# Altium schematic symbol library Analog Devices Data Converters Digital-to-Analog Converters.SchLib: 2231 symbols (part 98 of 135)
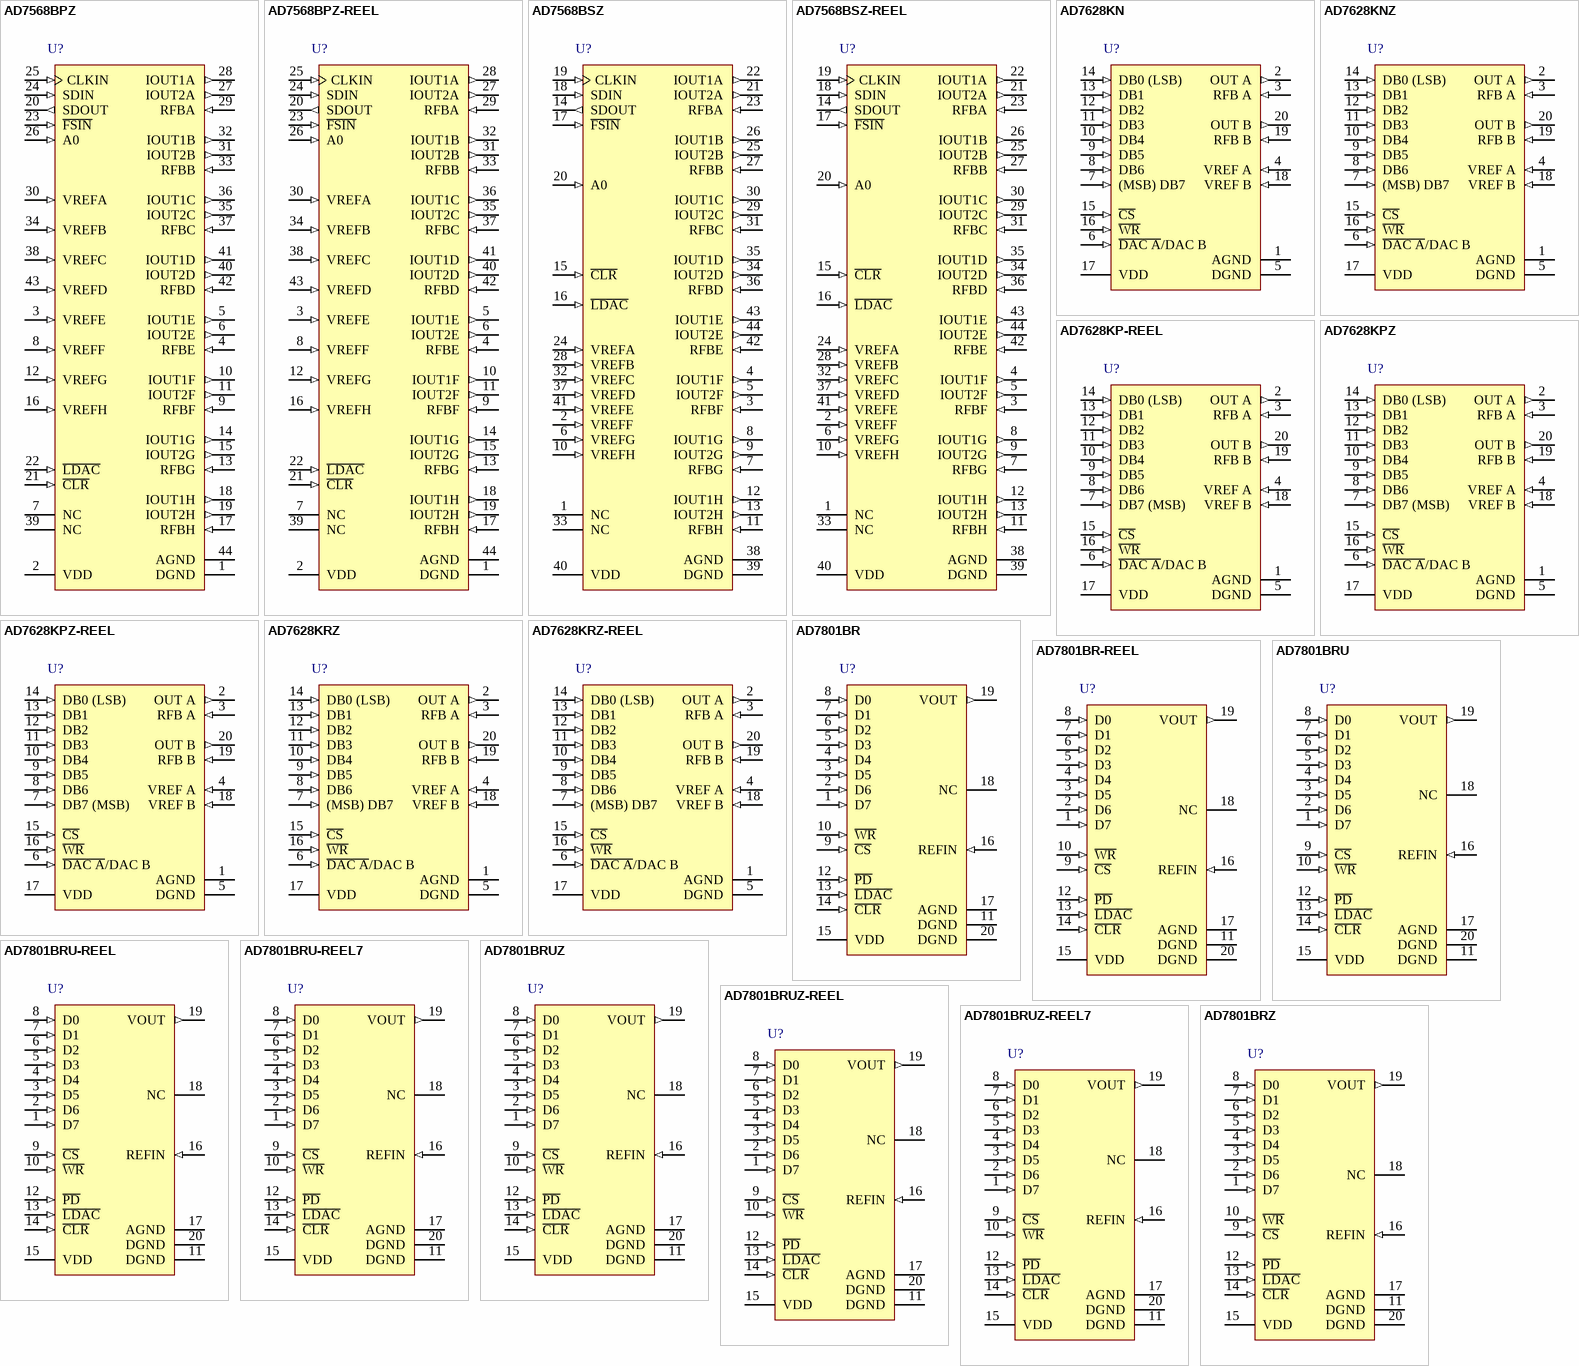
[diagram p210: symbols AD7568BPZ to AD7801BRZ]

## AD7801BRU-REEL
designator U?
Single 8-Bit Voltage Output Digital-to-Analog Converter with Parallel Interface, 2.7 to 5.5 V, -40 to +105 degC, RU-20, Reel; Generic Part Number: AD7801; Manufacturer: Analog Devices; PartNumber: AD7801BRU-REEL; # DAC Outputs: 1; Max V+: 5.5V; Op Pwr Diss: 12.9mW; Resolution (Bits): 8; Settling Time: 1.2µs; Single Supply: Yes; DatasheetVersion: Rev.0; PackageVersion: 2000; PackageReference: RU-20; PackageDescription: 20-Lead Thin Shrink Small Outline Package [TSSOP]; Supplier 1: Mouser; Supplier Part Number 1: N/A; Packing: Reel; RoHS: N; Mounting Technology: Surface Mount; Code_JEDEC: MO-153AC; ComponentLink1Description: Manufacturer URL; ComponentLink1URL: http://www.analog.com/en/index.html; ComponentLink2Description: Datasheet; ComponentLink2URL: http://www.analog.com/static/imported-files/data_sheets/AD7801.pdf; ComponentLink3Description: Package Specification; ComponentLink3URL: http://www.analog.com/static/imported-files/packages/364515793657813558433715854054607941441RU20.pdf; ComponentLink4Description: Product URL; ComponentLink4URL: http://www.analog.com/en/digital-to-analog-converters/da-converters/ad7801/products/product.html
footprint RU-20_N (TSOP, 20-Leads, Body 6.5x4.4mm, Pitch 0.65mm, IPC Medium Density)
footprint RU-20_L (TSOP, 20-Leads, Body 6.5x4.4mm, Pitch 0.65mm, IPC High Density)
footprint RU-20_M (TSOP, 20-Leads, Body 6.5x4.4mm, Pitch 0.65mm, IPC Low Density)
pins: 1 D7 (in) "Parallel Data Inputs. 8-bit data is loaded to the input register of the AD7801 under the control of C\S\ and W\R\.", 2 D6 (in) "Parallel Data Inputs. 8-bit data is loaded to the input register of the AD7801 under the control of C\S\ and W\R\.", 3 D5 (in) "Parallel Data Inputs. 8-bit data is loaded to the input register of the AD7801 under the control of C\S\ and W\R\.", 4 D4 (in) "Parallel Data Inputs. 8-bit data is loaded to the input register of the AD7801 under the control of C\S\ and W\R\.", 5 D3 (in) "Parallel Data Inputs. 8-bit data is loaded to the input register of the AD7801 under the control of C\S\ and W\R\.", 6 D2 (in) "Parallel Data Inputs. 8-bit data is loaded to the input register of the AD7801 under the control of C\S\ and W\R\.", 7 D1 (in) "Parallel Data Inputs. 8-bit data is loaded to the input register of the AD7801 under the control of C\S\ and W\R\.", 8 D0 (in) "Parallel Data Inputs. 8-bit data is loaded to the input register of the AD7801 under the control of C\S\ and W\R\.", 9 ~{CS} (in) "Chip Select. Active low logic input.", 10 ~{WR} (in) "Write Input. W\R\ is an active low logic input used in conjunction with C\S\ to write data to the input register.", 11 DGND (power) "Digital Ground", 12 ~{PD} (in) "Active low input used to put the part into low power mode reducing current consumption to less than 1 uA.", 13 ~{LDAC} (in) "Load DAC Logic Input. When this logic input is taken low the DAC output is updated with the contents of its DAC register. If L\D\A\C\ is permanently tied low the DAC is updated on the rising edge of W\R\.", 14 ~{CLR} (in) "Asynchronous Clear Input (Active Low). When this input is taken low the DAC register is loaded with all zeroes and the DAC output is cleared to zero volts.", 15 VDD (power) "Power Supply Input. This part can be operated from +2.7 V to +5.5 V and should be decoupled to GND.", 16 REFIN (in) "External Reference Input. This can be used as the reference for the DAC. The range on this reference input is 1 V to VDD/2. If REFIN is tied directly to VDD the internal VDD/2 reference is selected.", 17 AGND (power) "Analog Ground reference point and return point for all analog current on the part.", 18 NC "No Connect Pin.", 19 VOUT (out) "Analog Output Voltage from the DAC. The output amplifier can swing rail to rail on its output.", 20 DGND (power) "Digital Ground reference point and return point for all digital current on the part."

## AD7801BRU-REEL7
designator U?
Single 8-Bit Voltage Output Digital-to-Analog Converter with Parallel Interface, 2.7 to 5.5 V, -40 to +105 degC, RU-20, Reel; Generic Part Number: AD7801; Manufacturer: Analog Devices; PartNumber: AD7801BRU-REEL7; # DAC Outputs: 1; Max V+: 5.5V; Op Pwr Diss: 12.9mW; Resolution (Bits): 8; Settling Time: 1.2µs; Single Supply: Yes; DatasheetVersion: Rev.0; PackageVersion: 2000; PackageReference: RU-20; PackageDescription: 20-Lead Thin Shrink Small Outline Package [TSSOP]; Supplier 1: Digi-Key; Supplier Part Number 1: AD7801BRU-REEL7-ND; Supplier 2: Newark; Supplier Part Number 2: 09B5961; Supplier 3: Mouser; Supplier Part Number 3: 584-AD7801BRU-R7; Packing: Reel; RoHS: N; Mounting Technology: Surface Mount; Code_JEDEC: MO-153AC; ComponentLink1Description: Manufacturer URL; ComponentLink1URL: http://www.analog.com/en/index.html; ComponentLink2Description: Datasheet; ComponentLink2URL: http://www.analog.com/static/imported-files/data_sheets/AD7801.pdf; ComponentLink3Description: Package Specification; ComponentLink3URL: http://www.analog.com/static/imported-files/packages/364515793657813558433715854054607941441RU20.pdf; ComponentLink4Description: Product URL; ComponentLink4URL: http://www.analog.com/en/digital-to-analog-converters/da-converters/ad7801/products/product.html
footprint RU-20_N (TSOP, 20-Leads, Body 6.5x4.4mm, Pitch 0.65mm, IPC Medium Density)
footprint RU-20_L (TSOP, 20-Leads, Body 6.5x4.4mm, Pitch 0.65mm, IPC High Density)
footprint RU-20_M (TSOP, 20-Leads, Body 6.5x4.4mm, Pitch 0.65mm, IPC Low Density)
pins: 1 D7 (in) "Parallel Data Inputs. 8-bit data is loaded to the input register of the AD7801 under the control of C\S\ and W\R\.", 2 D6 (in) "Parallel Data Inputs. 8-bit data is loaded to the input register of the AD7801 under the control of C\S\ and W\R\.", 3 D5 (in) "Parallel Data Inputs. 8-bit data is loaded to the input register of the AD7801 under the control of C\S\ and W\R\.", 4 D4 (in) "Parallel Data Inputs. 8-bit data is loaded to the input register of the AD7801 under the control of C\S\ and W\R\.", 5 D3 (in) "Parallel Data Inputs. 8-bit data is loaded to the input register of the AD7801 under the control of C\S\ and W\R\.", 6 D2 (in) "Parallel Data Inputs. 8-bit data is loaded to the input register of the AD7801 under the control of C\S\ and W\R\.", 7 D1 (in) "Parallel Data Inputs. 8-bit data is loaded to the input register of the AD7801 under the control of C\S\ and W\R\.", 8 D0 (in) "Parallel Data Inputs. 8-bit data is loaded to the input register of the AD7801 under the control of C\S\ and W\R\.", 9 ~{CS} (in) "Chip Select. Active low logic input.", 10 ~{WR} (in) "Write Input. W\R\ is an active low logic input used in conjunction with C\S\ to write data to the input register.", 11 DGND (power) "Digital Ground", 12 ~{PD} (in) "Active low input used to put the part into low power mode reducing current consumption to less than 1 uA.", 13 ~{LDAC} (in) "Load DAC Logic Input. When this logic input is taken low the DAC output is updated with the contents of its DAC register. If L\D\A\C\ is permanently tied low the DAC is updated on the rising edge of W\R\.", 14 ~{CLR} (in) "Asynchronous Clear Input (Active Low). When this input is taken low the DAC register is loaded with all zeroes and the DAC output is cleared to zero volts.", 15 VDD (power) "Power Supply Input. This part can be operated from +2.7 V to +5.5 V and should be decoupled to GND.", 16 REFIN (in) "External Reference Input. This can be used as the reference for the DAC. The range on this reference input is 1 V to VDD/2. If REFIN is tied directly to VDD the internal VDD/2 reference is selected.", 17 AGND (power) "Analog Ground reference point and return point for all analog current on the part.", 18 NC "No Connect Pin.", 19 VOUT (out) "Analog Output Voltage from the DAC. The output amplifier can swing rail to rail on its output.", 20 DGND (power) "Digital Ground reference point and return point for all digital current on the part."

## AD7801BRUZ
designator U?
Single 8-Bit Voltage Output Digital-to-Analog Converter with Parallel Interface, 2.7 to 5.5 V, -40 to +105 degC, RU-20, Pb-Free, Tube; Generic Part Number: AD7801; Manufacturer: Analog Devices; PartNumber: AD7801BRUZ; # DAC Outputs: 1; Max V+: 5.5V; Op Pwr Diss: 12.9mW; Resolution (Bits): 8; Settling Time: 1.2µs; Single Supply: Yes; DatasheetVersion: Rev.0; PackageVersion: 2000; PackageReference: RU-20; PackageDescription: 20-Lead Thin Shrink Small Outline Package [TSSOP]; Supplier 1: Digi-Key; Supplier Part Number 1: AD7801BRUZ-ND; Supplier 2: Farnell; Supplier Part Number 2: 1319407; Supplier 3: Newark; Supplier Part Number 3: 19M8854; Supplier 4: Mouser; Supplier Part Number 4: 584-AD7801BRUZ; Packing: Tube; RoHS: Y; Mounting Technology: Surface Mount; Code_JEDEC: MO-153AC; ComponentLink1Description: Manufacturer URL; ComponentLink1URL: http://www.analog.com/en/index.html; ComponentLink2Description: Datasheet; ComponentLink2URL: http://www.analog.com/static/imported-files/data_sheets/AD7801.pdf; ComponentLink3Description: Package Specification; ComponentLink3URL: http://www.analog.com/static/imported-files/packages/364515793657813558433715854054607941441RU20.pdf; ComponentLink4Description: Product URL; ComponentLink4URL: http://www.analog.com/en/digital-to-analog-converters/da-converters/ad7801/products/product.html
footprint RU-20_N (TSOP, 20-Leads, Body 6.5x4.4mm, Pitch 0.65mm, IPC Medium Density)
footprint RU-20_L (TSOP, 20-Leads, Body 6.5x4.4mm, Pitch 0.65mm, IPC High Density)
footprint RU-20_M (TSOP, 20-Leads, Body 6.5x4.4mm, Pitch 0.65mm, IPC Low Density)
pins: 1 D7 (in) "Parallel Data Inputs. 8-bit data is loaded to the input register of the AD7801 under the control of C\S\ and W\R\.", 2 D6 (in) "Parallel Data Inputs. 8-bit data is loaded to the input register of the AD7801 under the control of C\S\ and W\R\.", 3 D5 (in) "Parallel Data Inputs. 8-bit data is loaded to the input register of the AD7801 under the control of C\S\ and W\R\.", 4 D4 (in) "Parallel Data Inputs. 8-bit data is loaded to the input register of the AD7801 under the control of C\S\ and W\R\.", 5 D3 (in) "Parallel Data Inputs. 8-bit data is loaded to the input register of the AD7801 under the control of C\S\ and W\R\.", 6 D2 (in) "Parallel Data Inputs. 8-bit data is loaded to the input register of the AD7801 under the control of C\S\ and W\R\.", 7 D1 (in) "Parallel Data Inputs. 8-bit data is loaded to the input register of the AD7801 under the control of C\S\ and W\R\.", 8 D0 (in) "Parallel Data Inputs. 8-bit data is loaded to the input register of the AD7801 under the control of C\S\ and W\R\.", 9 ~{CS} (in) "Chip Select. Active low logic input.", 10 ~{WR} (in) "Write Input. W\R\ is an active low logic input used in conjunction with C\S\ to write data to the input register.", 11 DGND (power) "Digital Ground", 12 ~{PD} (in) "Active low input used to put the part into low power mode reducing current consumption to less than 1 uA.", 13 ~{LDAC} (in) "Load DAC Logic Input. When this logic input is taken low the DAC output is updated with the contents of its DAC register. If L\D\A\C\ is permanently tied low the DAC is updated on the rising edge of W\R\.", 14 ~{CLR} (in) "Asynchronous Clear Input (Active Low). When this input is taken low the DAC register is loaded with all zeroes and the DAC output is cleared to zero volts.", 15 VDD (power) "Power Supply Input. This part can be operated from +2.7 V to +5.5 V and should be decoupled to GND.", 16 REFIN (in) "External Reference Input. This can be used as the reference for the DAC. The range on this reference input is 1 V to VDD/2. If REFIN is tied directly to VDD the internal VDD/2 reference is selected.", 17 AGND (power) "Analog Ground reference point and return point for all analog current on the part.", 18 NC "No Connect Pin.", 19 VOUT (out) "Analog Output Voltage from the DAC. The output amplifier can swing rail to rail on its output.", 20 DGND (power) "Digital Ground reference point and return point for all digital current on the part."

## AD7801BRUZ-REEL
designator U?
Single 8-Bit Voltage Output Digital-to-Analog Converter with Parallel Interface, 2.7 to 5.5 V, -40 to +105 degC, RU-20, Pb-Free, Reel; Generic Part Number: AD7801; Manufacturer: Analog Devices; PartNumber: AD7801BRUZ-REEL; # DAC Outputs: 1; Max V+: 5.5V; Op Pwr Diss: 12.9mW; Resolution (Bits): 8; Settling Time: 1.2µs; Single Supply: Yes; DatasheetVersion: Rev.0; PackageVersion: 2000; PackageReference: RU-20; PackageDescription: 20-Lead Thin Shrink Small Outline Package [TSSOP]; Supplier 1: Digi-Key; Supplier Part Number 1: AD7801BRUZ-REEL-ND; Supplier 2: Mouser; Supplier Part Number 2: 584-AD7801BRUZ-R; Packing: Reel; RoHS: Y; Mounting Technology: Surface Mount; Code_JEDEC: MO-153AC; ComponentLink1Description: Manufacturer URL; ComponentLink1URL: http://www.analog.com/en/index.html; ComponentLink2Description: Datasheet; ComponentLink2URL: http://www.analog.com/static/imported-files/data_sheets/AD7801.pdf; ComponentLink3Description: Package Specification; ComponentLink3URL: http://www.analog.com/static/imported-files/packages/364515793657813558433715854054607941441RU20.pdf; ComponentLink4Description: Product URL; ComponentLink4URL: http://www.analog.com/en/digital-to-analog-converters/da-converters/ad7801/products/product.html
footprint RU-20_N (TSOP, 20-Leads, Body 6.5x4.4mm, Pitch 0.65mm, IPC Medium Density)
footprint RU-20_L (TSOP, 20-Leads, Body 6.5x4.4mm, Pitch 0.65mm, IPC High Density)
footprint RU-20_M (TSOP, 20-Leads, Body 6.5x4.4mm, Pitch 0.65mm, IPC Low Density)
pins: 1 D7 (in) "Parallel Data Inputs. 8-bit data is loaded to the input register of the AD7801 under the control of C\S\ and W\R\.", 2 D6 (in) "Parallel Data Inputs. 8-bit data is loaded to the input register of the AD7801 under the control of C\S\ and W\R\.", 3 D5 (in) "Parallel Data Inputs. 8-bit data is loaded to the input register of the AD7801 under the control of C\S\ and W\R\.", 4 D4 (in) "Parallel Data Inputs. 8-bit data is loaded to the input register of the AD7801 under the control of C\S\ and W\R\.", 5 D3 (in) "Parallel Data Inputs. 8-bit data is loaded to the input register of the AD7801 under the control of C\S\ and W\R\.", 6 D2 (in) "Parallel Data Inputs. 8-bit data is loaded to the input register of the AD7801 under the control of C\S\ and W\R\.", 7 D1 (in) "Parallel Data Inputs. 8-bit data is loaded to the input register of the AD7801 under the control of C\S\ and W\R\.", 8 D0 (in) "Parallel Data Inputs. 8-bit data is loaded to the input register of the AD7801 under the control of C\S\ and W\R\.", 9 ~{CS} (in) "Chip Select. Active low logic input.", 10 ~{WR} (in) "Write Input. W\R\ is an active low logic input used in conjunction with C\S\ to write data to the input register.", 11 DGND (power) "Digital Ground", 12 ~{PD} (in) "Active low input used to put the part into low power mode reducing current consumption to less than 1 uA.", 13 ~{LDAC} (in) "Load DAC Logic Input. When this logic input is taken low the DAC output is updated with the contents of its DAC register. If L\D\A\C\ is permanently tied low the DAC is updated on the rising edge of W\R\.", 14 ~{CLR} (in) "Asynchronous Clear Input (Active Low). When this input is taken low the DAC register is loaded with all zeroes and the DAC output is cleared to zero volts.", 15 VDD (power) "Power Supply Input. This part can be operated from +2.7 V to +5.5 V and should be decoupled to GND.", 16 REFIN (in) "External Reference Input. This can be used as the reference for the DAC. The range on this reference input is 1 V to VDD/2. If REFIN is tied directly to VDD the internal VDD/2 reference is selected.", 17 AGND (power) "Analog Ground reference point and return point for all analog current on the part.", 18 NC "No Connect Pin.", 19 VOUT (out) "Analog Output Voltage from the DAC. The output amplifier can swing rail to rail on its output.", 20 DGND (power) "Digital Ground reference point and return point for all digital current on the part."

## AD7801BRUZ-REEL7
designator U?
Single 8-Bit Voltage Output Digital-to-Analog Converter with Parallel Interface, 2.7 to 5.5 V, -40 to +105 degC, RU-20, Pb-Free, Reel; Generic Part Number: AD7801; Manufacturer: Analog Devices; PartNumber: AD7801BRUZ-REEL7; # DAC Outputs: 1; Max V+: 5.5V; Op Pwr Diss: 12.9mW; Resolution (Bits): 8; Settling Time: 1.2µs; Single Supply: Yes; DatasheetVersion: Rev.0; PackageVersion: 2000; PackageReference: RU-20; PackageDescription: 20-Lead Thin Shrink Small Outline Package [TSSOP]; Supplier 1: Digi-Key; Supplier Part Number 1: AD7801BRUZ-REEL7TR-ND; Supplier 2: Digi-Key; Supplier Part Number 2: AD7801BRUZ-REEL7CT-ND; Supplier 3: Digi-Key; Supplier Part Number 3: AD7801BRUZ-REEL7DKR-ND; Supplier 4: Mouser; Supplier Part Number 4: 584-AD7801BRUZ-R7; Packing: Reel; RoHS: Y; Mounting Technology: Surface Mount; Code_JEDEC: MO-153AC; ComponentLink1Description: Manufacturer URL; ComponentLink1URL: http://www.analog.com/en/index.html; ComponentLink2Description: Datasheet; ComponentLink2URL: http://www.analog.com/static/imported-files/data_sheets/AD7801.pdf; ComponentLink3Description: Package Specification; ComponentLink3URL: http://www.analog.com/static/imported-files/packages/364515793657813558433715854054607941441RU20.pdf; ComponentLink4Description: Product URL; ComponentLink4URL: http://www.analog.com/en/digital-to-analog-converters/da-converters/ad7801/products/product.html
footprint RU-20_N (TSOP, 20-Leads, Body 6.5x4.4mm, Pitch 0.65mm, IPC Medium Density)
footprint RU-20_L (TSOP, 20-Leads, Body 6.5x4.4mm, Pitch 0.65mm, IPC High Density)
footprint RU-20_M (TSOP, 20-Leads, Body 6.5x4.4mm, Pitch 0.65mm, IPC Low Density)
pins: 1 D7 (in) "Parallel Data Inputs. 8-bit data is loaded to the input register of the AD7801 under the control of C\S\ and W\R\.", 2 D6 (in) "Parallel Data Inputs. 8-bit data is loaded to the input register of the AD7801 under the control of C\S\ and W\R\.", 3 D5 (in) "Parallel Data Inputs. 8-bit data is loaded to the input register of the AD7801 under the control of C\S\ and W\R\.", 4 D4 (in) "Parallel Data Inputs. 8-bit data is loaded to the input register of the AD7801 under the control of C\S\ and W\R\.", 5 D3 (in) "Parallel Data Inputs. 8-bit data is loaded to the input register of the AD7801 under the control of C\S\ and W\R\.", 6 D2 (in) "Parallel Data Inputs. 8-bit data is loaded to the input register of the AD7801 under the control of C\S\ and W\R\.", 7 D1 (in) "Parallel Data Inputs. 8-bit data is loaded to the input register of the AD7801 under the control of C\S\ and W\R\.", 8 D0 (in) "Parallel Data Inputs. 8-bit data is loaded to the input register of the AD7801 under the control of C\S\ and W\R\.", 9 ~{CS} (in) "Chip Select. Active low logic input.", 10 ~{WR} (in) "Write Input. W\R\ is an active low logic input used in conjunction with C\S\ to write data to the input register.", 11 DGND (power) "Digital Ground", 12 ~{PD} (in) "Active low input used to put the part into low power mode reducing current consumption to less than 1 uA.", 13 ~{LDAC} (in) "Load DAC Logic Input. When this logic input is taken low the DAC output is updated with the contents of its DAC register. If L\D\A\C\ is permanently tied low the DAC is updated on the rising edge of W\R\.", 14 ~{CLR} (in) "Asynchronous Clear Input (Active Low). When this input is taken low the DAC register is loaded with all zeroes and the DAC output is cleared to zero volts.", 15 VDD (power) "Power Supply Input. This part can be operated from +2.7 V to +5.5 V and should be decoupled to GND.", 16 REFIN (in) "External Reference Input. This can be used as the reference for the DAC. The range on this reference input is 1 V to VDD/2. If REFIN is tied directly to VDD the internal VDD/2 reference is selected.", 17 AGND (power) "Analog Ground reference point and return point for all analog current on the part.", 18 NC "No Connect Pin.", 19 VOUT (out) "Analog Output Voltage from the DAC. The output amplifier can swing rail to rail on its output.", 20 DGND (power) "Digital Ground reference point and return point for all digital current on the part."

## AD7801BRZ
designator U?
Single 8-Bit Voltage Output Digital-to-Analog Converter with Parallel Interface, 2.7 to 5.5 V, -40 to +105 degC, RW-20, Pb-Free, Tube; Generic Part Number: AD7801; Manufacturer: Analog Devices; PartNumber: AD7801BRZ; # DAC Outputs: 1; Max V+: 5.5V; Op Pwr Diss: 12.9mW; Resolution (Bits): 8; Settling Time: 1.2µs; Single Supply: Yes; DatasheetVersion: Rev.0; PackageVersion: 060706-A; PackageReference: RW-20; PackageDescription: 20-Lead Standard Small Outline Package [SOIC_W] Wide Body; Supplier 1: Digi-Key; Supplier Part Number 1: AD7801BRZ-ND; Supplier 2: Farnell; Supplier Part Number 2: 9425829; Supplier 3: Newark; Supplier Part Number 3: 19M0902; Supplier 4: Mouser; Supplier Part Number 4: 584-AD7801BRZ; Packing: Tube; RoHS: Y; Mounting Technology: Surface Mount; Code_JEDEC: MS-013-AC; ComponentLink1Description: Manufacturer URL; ComponentLink1URL: http://www.analog.com/en/index.html; ComponentLink2Description: Datasheet; ComponentLink2URL: http://www.analog.com/static/imported-files/data_sheets/AD7801.pdf; ComponentLink3Description: Package Specification; ComponentLink3URL: http://www.analog.com/static/imported-files/packages/233848RW_20.pdf; ComponentLink4Description: Product URL; ComponentLink4URL: http://www.analog.com/en/digital-to-analog-converters/da-converters/ad7801/products/product.html
footprint RW-20_N (SOIC, 20-Leads, Body 12.8x7.5mm, Pitch 1.27mm, IPC Medium Density)
footprint RW-20_L (SOIC, 20-Leads, Body 12.8x7.5mm, Pitch 1.27mm, IPC High Density)
footprint RW-20_M (SOIC, 20-Leads, Body 12.8x7.5mm, Pitch 1.27mm, IPC Low Density)
pins: 1 D7 (in) "Parallel Data Inputs. 8-bit data is loaded to the input register of the AD7801 under the control of C\S\ and W\R\.", 2 D6 (in) "Parallel Data Inputs. 8-bit data is loaded to the input register of the AD7801 under the control of C\S\ and W\R\.", 3 D5 (in) "Parallel Data Inputs. 8-bit data is loaded to the input register of the AD7801 under the control of C\S\ and W\R\.", 4 D4 (in) "Parallel Data Inputs. 8-bit data is loaded to the input register of the AD7801 under the control of C\S\ and W\R\.", 5 D3 (in) "Parallel Data Inputs. 8-bit data is loaded to the input register of the AD7801 under the control of C\S\ and W\R\.", 6 D2 (in) "Parallel Data Inputs. 8-bit data is loaded to the input register of the AD7801 under the control of C\S\ and W\R\.", 7 D1 (in) "Parallel Data Inputs. 8-bit data is loaded to the input register of the AD7801 under the control of C\S\ and W\R\.", 8 D0 (in) "Parallel Data Inputs. 8-bit data is loaded to the input register of the AD7801 under the control of C\S\ and W\R\.", 9 ~{CS} (in) "Chip Select. Active low logic input.", 10 ~{WR} (in) "Write Input. W\R\ is an active low logic input used in conjunction with C\S\ to write data to the input register.", 11 DGND (power) "Digital Ground", 12 ~{PD} (in) "Active low input used to put the part into low power mode reducing current consumption to less than 1 µA.", 13 ~{LDAC} (in) "Load DAC Logic Input. When this logic input is taken low the DAC output is updated with the contents of its DAC register. If L\D\A\C\ is permanently tied low the DAC is updated on the rising edge of W\R\.", 14 ~{CLR} (in) "Asynchronous Clear Input (Active Low). When this input is taken low the DAC register is loaded with all zeroes and the DAC output is cleared to zero volts.", 15 VDD (power) "Power Supply Input. This part can be operated from +2.7 V to +5.5 V and should be decoupled to GND.", 16 REFIN (in) "External Reference Input. This can be used as the reference for the DAC. The range on this reference input is 1 V to VDD/2. If REFIN is tied directly to VDD the internal VDD/2 reference is selected.", 17 AGND (power) "Analog Ground reference point and return point for all analog current on the part.", 18 NC "No Connect Pin.", 19 VOUT (out) "Analog Output Voltage from the DAC. The output amplifier can swing rail to rail on its output.", 20 DGND (power) "Digital Ground reference point and return point for all digital current on the part."

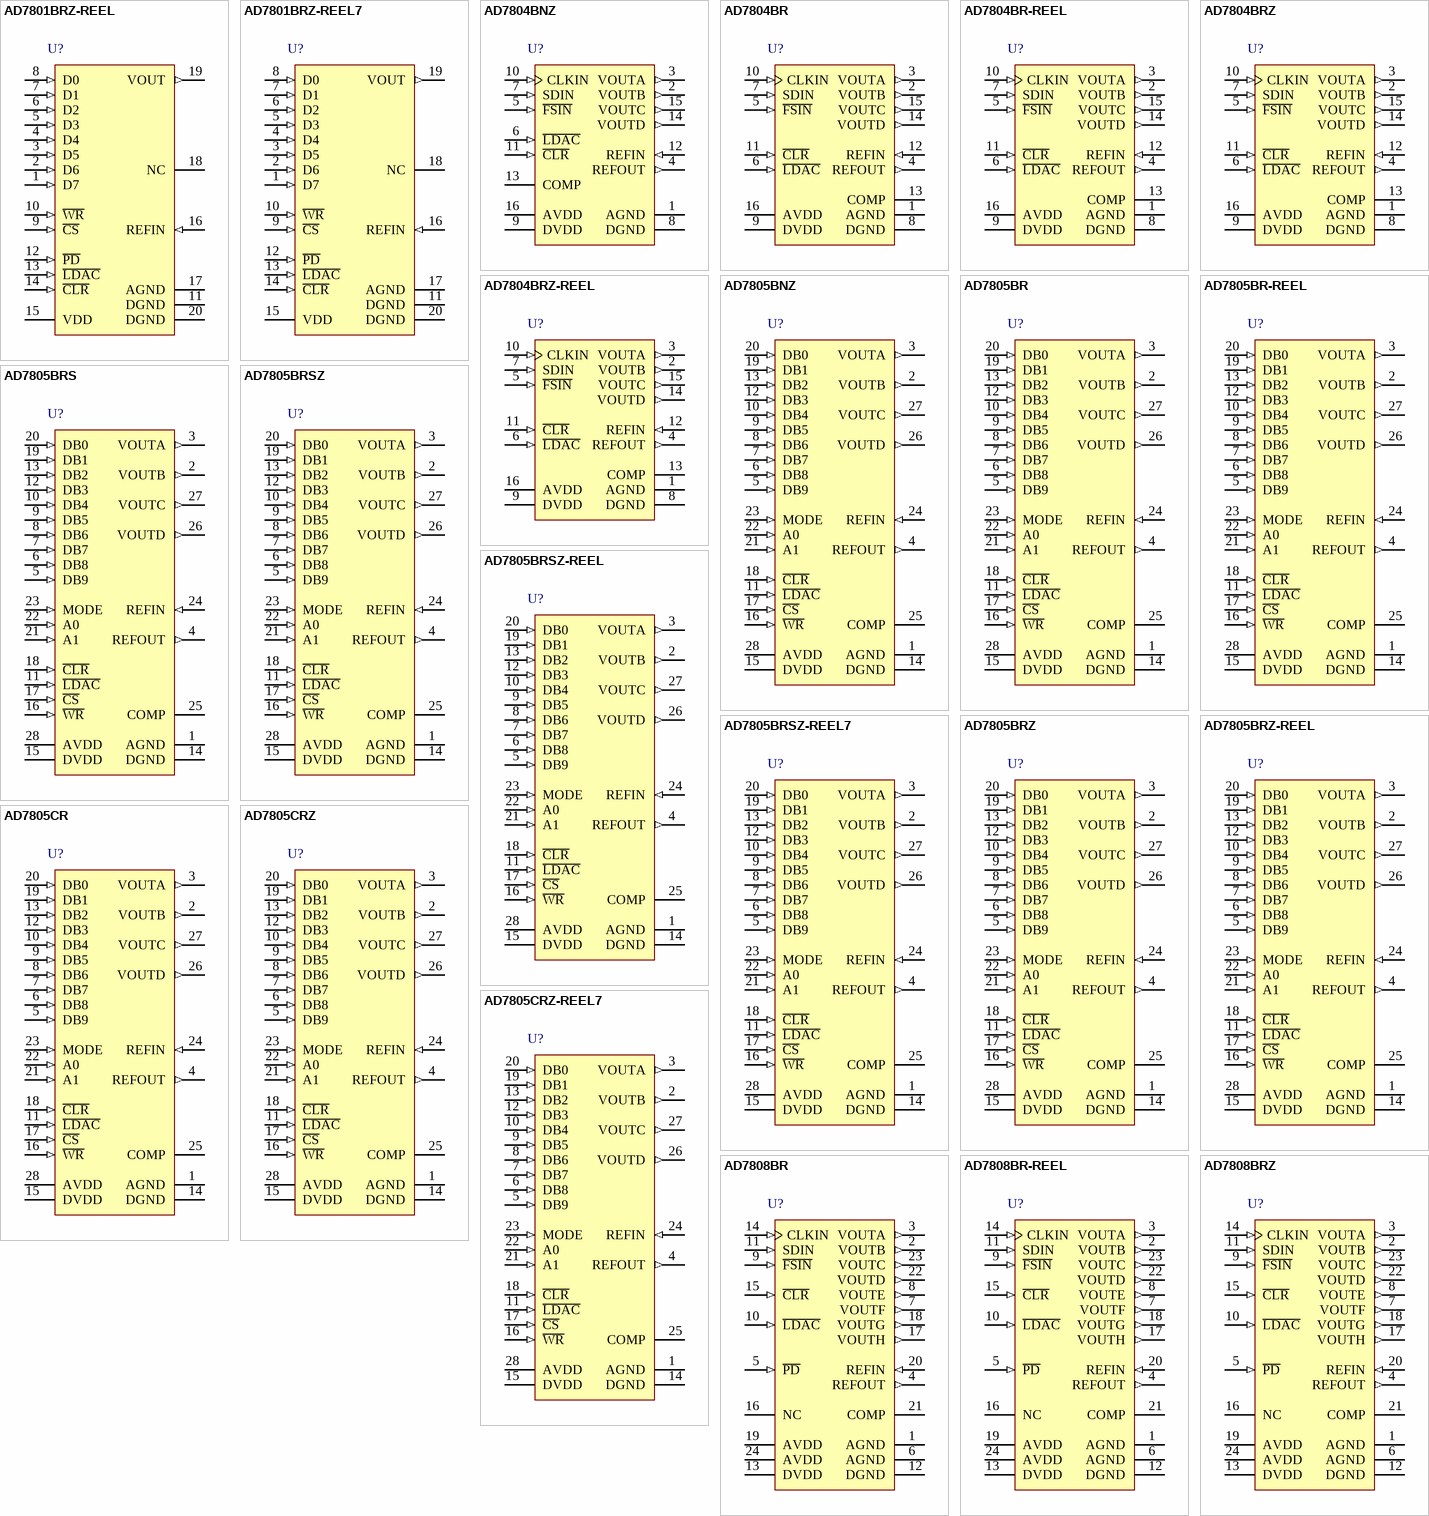
[diagram p73: symbols AD7801BRZ-REEL to AD7808BRZ]
